# Altium footprint library PCBLIB.PcbLib: 557 footprints (part 1 of 36)
Each footprint in its own frame and in the unit in brackets; x right, y up, seen from the top. Pads: shape width x height; smd on the part's side, far side on the other; paste and mask are expansions set on the pad; w line width, h text height; cw(c..) or ccw(c..) is an arc to the next point about the centre after c.
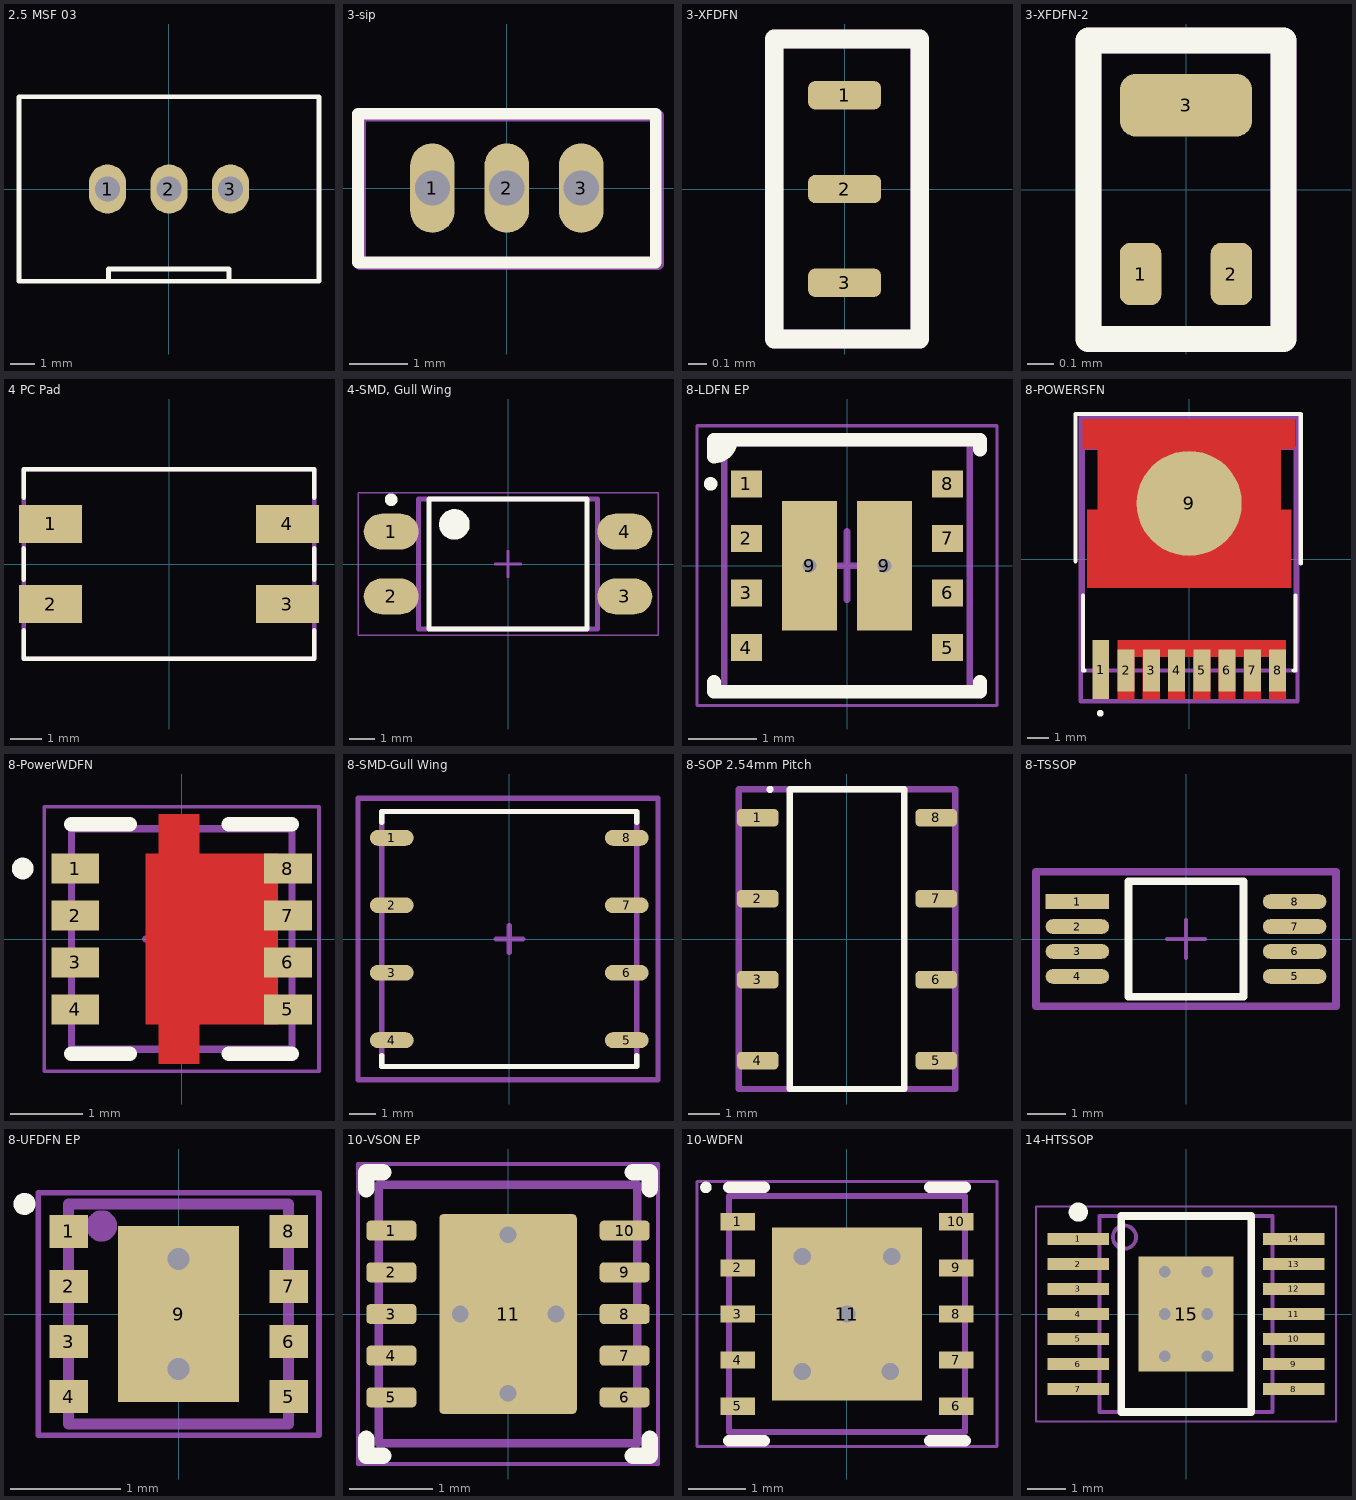
[diagram p0: the footprints below, top view; thin cyan lines are the x and y axes]

## 2.5 MSF 03 [mm]
pads (3):
  oval 1.5x2 hole 1: 1(-2.5,0) 2(0,0) 3(2.5,0)
Top Overlay:
  lines w0.2: -2.461,-3.75 -2.461,-3.254 2.449,-3.254 2.449,-3.75 ; -6.1,-3.75 6.1,-3.75 6.1,3.75 -6.1,3.75 -6.1,-3.75 ; -6.1,-3.75 -6.1,-3.75
ASM Top:
  lines w0.15: -6.1,-3.75 6.1,-3.75 6.1,3.75 ; -6.1,-3.75 -6.1,-3.75 ; -6.1,-3.75 -6.1,3.75 6.1,3.75 ; 6.1,3.75 6.1,3.75
  text ".designator" at -1.18,-0.01 h0.8
3D body "lumberg_2_5_MSF_03.stp": height 22.51, standoff -3.29, extent -6.1,-3.75 6.1,3.75

## 3-sip [mil]
height 314.96
pads (3):
  oval 30x60 hole 23.62: 1(-50,0) 2(0,0) 3(50,0)
Top Overlay:
  lines w7.87: -100,-50 -100,50 100,50 100,-50 -100,-50
ASM Top:
  lines w7.87: -98.43,-51.18 101.57,-51.18 101.57,48.82 -98.43,48.82 -98.43,-51.18
  text ".designator" at -47.24,-11.81 h31.5
3D body "HallEffect.stp": height 204.09, standoff -51.82, extent -116.82,-103.4 117.27,101.13

## 3-XFDFN [mm]
pads (3):
  rrect50% 0.39x0.15 smd mask+0.05: 1(0,0.5) 2(0,0) 3(0,-0.5)
Top Overlay:
  lines w0.1: -0.375,-0.8 0.4,-0.8 0.4,0.7 0.4,0.8 0.3,0.8 -0.375,0.8 -0.375,-0.8
ASM Top:
  lines w0.1: -0.375,-0.8 -0.375,0.8 0.3,0.8 0.4,0.8 0.4,0.7 0.4,-0.8 -0.375,-0.8
  text ".designator" at -0.275,-0.1 h0.8
3D body: height 0.35, standoff 0, extent -0.375,-0.8 0.4,0.8

## 3-XFDFN-2 [mm]
pads (3):
  rrect50% 0.16x0.24 smd mask+0.05: 1(-0.175,-0.325) 2(0.175,-0.325)
  rrect50% 0.51x0.24 smd mask+0.05: 3(0,0.325)
Top Overlay:
  lines w0.1: -0.375,-0.575 -0.375,0.575 -0.275,0.575 0.375,0.575 0.375,-0.575 -0.375,-0.575
ASM Top:
  lines w0.1: -0.375,-0.575 0.375,-0.575 0.375,0.575 -0.275,0.575 -0.375,0.575 -0.375,-0.575
  text ".designator" at -0.275,-0.1 h0.8
3D body "CSD13381F4--3DModel-STEP-56544.STEP": height 0.36, standoff 0.01, extent -0.3,-0.5 0.3,0.5

## 4 PC Pad [mm] "0.362\" L x 0.236\" W (9.20mm x 6.00mm)"
height 0.209
pads (4):
  rect 2x1.2 smd mask+0.05: 1(-3.75,1.27) 2(-3.75,-1.27) 3(3.75,-1.27) 4(3.75,1.27)
Top Overlay:
  lines w0.15: -4.6,-2.1 -4.6,-3 4.6,-3 4.6,-2.1 ; -4.6,-0.5 -4.6,0.5 ; -4.6,2.1 -4.6,3 4.6,3 4.6,2.1 ; 4.6,-0.5 4.6,0.5
ASM Top:
  lines w0.15: -4.6,-3 -4.6,3 4.6,3 4.6,-3 -4.6,-3
  text ".designator" at -1.8,0 h0.8
3D body "srf0905.stp": height 4.81, standoff 0.01, extent -4.601,-3 4.601,3

## 4-SMD, Gull Wing [mm] "SOP, 4-Leads, Body 4,60x6,50mm, Pitch 2,54mm, IPC Medium Density"
height 4
pads (4):
  oval 2.15x1.4 smd: 1(-4.575,1.27) 2(-4.575,-1.27) 3(4.575,-1.27) 4(4.575,1.27)
Top Overlay:
  circle w0.6: c-2.1,1.55 r0.3
  circle w0.25: c-4.575,2.52 r0.125
  lines w0.2: -3.1,-2.55 3.1,-2.55 3.1,2.55 -3.1,2.55 -3.1,-2.55
Mechanical 15:
  lines w0.05: -5.875,-2.8 5.875,-2.8 5.875,2.8 -5.875,2.8 -5.875,-2.8
  lines w0.1: -0.5,0 0.5,0 ; 0,-0.5 0,0.5
ASM Top:
  lines w0.2: -3.5,-2.55 -3.5,2.55 3.5,2.55 3.5,-2.55 -3.5,-2.55
  text ".designator" at -1.63,-0.19 h0.8
3D body "User Library-PDIP_4_smd.step": height 3.51, standoff 0.01, extent -5.08,-2.3 5.08,2.3

## 8-LDFN EP [mm] "MicroSIP, 8-Leads, Body 3.50x3.50mm, Pitch 0.80mm, Thermal Pad 0.00x0.00mm, IPC Medium Density"
height 1.75
pads (10):
  rect 0.45x0.4 smd: 1(-1.475,1.2) 2(-1.475,0.4) 3(-1.475,-0.4) 4(-1.475,-1.2) 5(1.475,-1.2) 6(1.475,-0.4) 7(1.475,0.4) 8(1.475,1.2)
  rect 0.8x1.9 smd paste-2: 9(-0.55,0) 9(0.55,0)
via -0.55,0 diameter 0.6 hole 0.2
via 0.55,0 diameter 0.6 hole 0.2
Top Overlay:
  circle w0.1: c-2,1.2 r0.05
  region: -1.95,1.85 -1.7,1.85 -1.95,1.6
  lines w0.2: -1.95,-1.7 -1.95,-1.85 1.95,-1.85 1.95,-1.7 ; -1.7,1.85 cw(c-1.95,1.85) -1.95,1.6 -1.95,1.85 1.95,1.85 1.95,1.7
Top Paste:
  rectangle: 0.17,0.145 0.93,0.905
  region: -0.17,0.905 -0.93,0.905 -0.93,0.145 -0.17,0.145
  region: -0.17,-0.145 -0.93,-0.145 -0.93,-0.905 -0.17,-0.905
  rectangle: 0.17,-0.905 0.93,-0.145
Mechanical 15:
  lines w0.05: -2.2,-2.05 -2.2,2.05 2.2,2.05 2.2,-2.05 -2.2,-2.05
  lines w0.1: -0.5,0 0.5,0 ; 0,-0.5 0,0.5
ASM Top:
  lines w0.1: -1.8,-1.8 1.8,-1.8 1.8,1.8 -1.8,1.8 -1.8,-1.8
  text ".designator" at 0,0.15 h0.8
3D body "TI LMZ21701.STEP": height 1.75, standoff 0, extent -1.75,-1.75 1.75,1.75

## 8-POWERSFN [mm]
pads (9):
  rect 0.8x2.8 smd paste-1000 mask+0: 1(-4.2,-5.25)
  rect 0.8x2 smd paste-1000 mask+0: 2(-2.995,-5.288) 3(-1.797,-5.288) 4(-0.6,-5.288) 5(0.605,-5.288) 6(1.795,-5.288) 7(3.007,-5.288) 8(4.204,-5.288)
  round 5 smd paste-1000 mask+0: 9(0,2.65)
Top Layer:
  region: -5.05,6.65 5.05,6.65 5.05,5.25 4.35,5.25 4.35,2.35 4.85,2.35 4.85,-1.35 -4.85,-1.35 -4.85,2.35 -4.35,2.35 -4.35,5.25 -5.05,5.25
  region: -3.4,-3.85 4.6,-3.85 4.6,-6.65 3.8,-6.65 3.8,-4.65 3.4,-4.65 3.4,-6.65 2.6,-6.65 2.6,-4.65 2.2,-4.65 2.2,-6.65 1.4,-6.65 1.4,-4.65 1,-4.65 1,-6.65 0.2,-6.65 0.2,-4.65 -0.2,-4.65 -0.2,-6.65 -1,-6.65 -1,-4.65 -1.4,-4.65 -1.4,-6.65 -2.2,-6.65 -2.2,-4.65 -2.6,-4.65 -2.6,-6.65 -3.4,-6.65
Top Overlay:
  circle w0.25: c-4.225,-7.325 r0.035
  lines w0.2: -5.4,-0.1 -5.4,6.9 5.3,6.9 5.3,-0.2 ; -5.05,-1.725 -5.05,-5.288 -4.975,-5.288 ; 4.975,-5.288 5.05,-5.288 5.05,-1.725
Top Paste:
  circle w0.5: c-4.2,5.83 r0.25
  circle w0.5: c-3,5.83 r0.25
  circle w0.5: c-1.8,5.83 r0.25
  circle w0.5: c-0.6,5.83 r0.25
  circle w0.5: c0.6,5.83 r0.25
  circle w0.5: c1.8,5.83 r0.25
  circle w0.5: c3,5.83 r0.25
  circle w0.5: c4.2,5.83 r0.25
  circle w0.5: c-3,4.63 r0.25
  circle w0.5: c-1.8,4.63 r0.25
  circle w0.5: c-0.6,4.63 r0.25
  circle w0.5: c0.6,4.63 r0.25
  circle w0.5: c1.8,4.63 r0.25
  circle w0.5: c3,4.63 r0.25
  circle w0.5: c-3,3.43 r0.25
  circle w0.5: c-1.8,3.43 r0.25
  circle w0.5: c-0.6,3.43 r0.25
  circle w0.5: c0.6,3.43 r0.25
  circle w0.5: c1.8,3.43 r0.25
  circle w0.5: c3,3.43 r0.25
  circle w0.5: c-3,2.23 r0.25
  circle w0.5: c-1.8,2.23 r0.25
  circle w0.5: c-0.6,2.23 r0.25
  circle w0.5: c0.6,2.23 r0.25
  circle w0.5: c1.8,2.23 r0.25
  circle w0.5: c3,2.23 r0.25
  circle w0.5: c-4.2,1.03 r0.25
  circle w0.5: c-3,1.03 r0.25
  circle w0.5: c-1.8,1.03 r0.25
  circle w0.5: c-0.6,1.03 r0.25
  circle w0.5: c0.6,1.03 r0.25
  circle w0.5: c1.8,1.03 r0.25
  circle w0.5: c3,1.03 r0.25
  circle w0.5: c4.2,1.03 r0.25
  circle w0.5: c-4.2,-0.17 r0.25
  circle w0.5: c-3,-0.17 r0.25
  circle w0.5: c-1.8,-0.17 r0.25
  circle w0.5: c-0.6,-0.17 r0.25
  circle w0.5: c0.6,-0.17 r0.25
  circle w0.5: c1.8,-0.17 r0.25
  circle w0.5: c3,-0.17 r0.25
  circle w0.5: c4.2,-0.17 r0.25
  rectangle: -4.55,-6.55 -3.85,-3.95
  rectangle: -3.35,-6.55 -2.65,-3.95
  rectangle: -2.15,-6.55 -1.45,-3.95
  rectangle: -0.95,-6.55 -0.25,-3.95
  rectangle: 0.25,-6.55 0.95,-3.95
  rectangle: 1.45,-6.55 2.15,-3.95
  rectangle: 2.65,-6.55 3.35,-3.95
  rectangle: 3.85,-6.55 4.55,-3.95
Mechanical 15:
  lines w0.2: -5.15,-6.75 5.15,-6.75 ; -5.15,-6.75 -5.15,6.75 ; -5.15,-6.75 -5.15,6.75 ; -5.15,-6.75 5.15,-6.75 ; -5.15,6.75 5.15,6.75 ; -5.15,6.75 5.15,6.75 ; 5.15,-6.75 5.15,6.75 ; 5.15,-6.75 5.15,6.75
Mechanical 16:
  lines w0.1: -0.5,0 0.5,0 ; 0,-0.5 0,0.5
ASM Top:
  lines w0.2: -5.05,-5.288 -5.05,5.288 5.05,5.288 5.05,-5.288 -5.05,-5.288
  text ".Designator" at 0,0.188 h1
3D body "Trans_Infineon_IPT111N20NFDATMA1_eec.STEP": height 2.4, standoff 0, extent -4.95,-5.837 4.95,5.838

## 8-PowerWDFN [mm] "DFN, 8-Leads, Body 3.05x3.05mm, Pitch 0.65mm"
height 0.8
pads (8):
  rect 0.66x0.42 smd paste-10: 1(-1.47,0.975) 2(-1.47,0.325) 3(-1.47,-0.325) 4(-1.47,-0.975) 5(1.47,-0.975) 6(1.47,-0.325) 7(1.47,0.325) 8(1.47,0.975)
Top Layer:
  region: 1.33,-1.185 1.33,1.185 -0.5,1.185 -0.5,-1.185
  region: 0.25,-1.73 0.25,1.73 -0.32,1.73 -0.32,-1.73
Top Overlay:
  circle w0.2: c-2.2,0.975 r0.05
  lines w0.2: -1.525,-1.585 -0.72,-1.585 ; -1.525,1.585 -0.72,1.585 ; 0.65,-1.585 1.525,-1.585 ; 0.65,1.585 1.525,1.585
Top Paste:
  region: -1.14,-1.095 -1.14,-0.855 -1.74,-0.855 -1.74,-1.095
  region: -1.14,-0.445 -1.14,-0.205 -1.74,-0.205 -1.74,-0.445
  region: -1.14,0.205 -1.14,0.445 -1.74,0.445 -1.74,0.205
  region: -1.14,0.855 -1.14,1.095 -1.74,1.095 -1.74,0.855
  region: 1.8,0.855 1.8,1.095 1.2,1.095 1.2,0.855
  region: 1.8,0.205 1.8,0.445 1.2,0.445 1.2,0.205
  region: 1.8,-0.445 1.8,-0.205 1.2,-0.205 1.2,-0.445
  region: 1.8,-1.095 1.8,-0.855 1.2,-0.855 1.2,-1.095
  rectangle: -0.244,1.3 0.191,1.65
  rectangle: -0.244,-1.65 0.191,-1.3
  region: -0.35,0.545 -0.35,-0.545 1,-0.545 1,0.545
  region: -0.35,-0.855 -0.35,-1.095 1.05,-1.095 1.05,-0.855
  region: -0.35,1.095 -0.35,0.855 1.05,0.855 1.05,1.095
Mechanical 15:
  lines w0.05: -1.9,-1.83 -1.9,1.83 1.9,1.83 1.9,-1.83 -1.9,-1.83
  lines w0.1: -0.5,0 0.5,0 ; 0,-0.5 0,0.5
ASM Top:
  lines w0.1: -1.525,-1.525 1.525,-1.525 1.525,1.525 -1.525,1.525 -1.525,-1.525
  text ".designator" at -0.5,-0.325 h0.8
3D body: height 0.8, standoff 0, extent -1.525,-1.525 1.525,1.525

## 8-SMD-Gull Wing [mm]
height 4.2
pads (9):
  oval 1.65x0.6 smd mask+0.05: 1(-4.425,3.81) 1(-4.425,3.81) 2(-4.425,1.27) 3(-4.425,-1.27) 4(-4.425,-3.81) 5(4.425,-3.81) 6(4.425,-1.27) 7(4.425,1.27) 8(4.425,3.81)
Top Overlay:
  lines w0.2: -4.8,-4.4 -4.8,-4.8 4.8,-4.8 4.8,-4.4 ; -4.8,4.4 -4.8,4.8 4.8,4.8 4.8,4.4
Mechanical 15:
  lines w0.2: -0.5,0 0.5,0 ; 0,-0.5 0,0.5 ; -5.7,-5.3 -5.7,5.3 5.6,5.3 5.6,-5.3 -5.7,-5.3
ASM Top:
  lines w0.2: -4.8,-4.8 -4.8,4.8 4.8,4.8 4.8,-4.8 -4.8,-4.8
  text ".designator" at -0.4,0 h0.8
3D body "SI8920BC-IP.stp": height 4.19, standoff 0, extent -4.825,-4.825 4.825,4.825

## 8-SOP 2.54mm Pitch [mm] "8-SOP (0.150\", 3.81mm Width)"
pads (8):
  rrect50% 1.3x0.55 smd paste-0.05 mask+0.05: 1(-2.8,3.81) 2(-2.8,1.27) 3(-2.8,-1.27) 4(-2.8,-3.81) 5(2.8,-3.81) 6(2.8,-1.27) 7(2.8,1.27) 8(2.8,3.81)
Top Overlay:
  circle w0.2: c-2.415,4.7 r0.011
  lines w0.2: 1.8,4.7 1.8,-4.7 -1.8,-4.7 -1.8,4.7 1.8,4.7 ; 1.8,4.7 1.8,4.7
ASM Top:
  circle w0.2: c-2.415,3.81 r0.01
  lines w0.2: -3.4,-4.7 -3.4,4.7 3.4,4.7 3.4,-4.7 ; -3.4,-4.7 -3.4,-4.7 ; -3.4,-4.7 3.4,-4.7 ; 3.4,-4.7 3.4,-4.7
  text ".designator" at -0.4,-0.1 h0.8
3D body "User Library-sop8-2_54.step": height 2.16, standoff 0.11, extent -3.4,-4.7 3.4,4.7

## 8-TSSOP [mm]
pads (8):
  rect 1.655x0.381 smd paste+0 mask+0: 1(-2.825,0.975)
  rrect100% 1.655x0.381 smd paste+0 mask+0: 2(-2.825,0.325) 3(-2.825,-0.325) 4(-2.825,-0.975) 5(2.825,-0.975) 6(2.825,-0.325) 7(2.825,0.325) 8(2.825,0.975)
Top Overlay:
  lines w0.2: -1.498,-1.5 1.498,-1.5 1.498,1.5 -1.498,1.5 -1.498,-1.5
Mechanical 15:
  lines w0.1: -0.5,0 0.5,0 ; 0,-0.5 0,0.5
  lines w0.2: -3.903,-1.75 3.903,-1.75 3.903,1.75 -3.903,1.75 -3.903,-1.75
ASM Top:
  lines w0.2: -3.903,-1.75 3.903,-1.75 3.903,1.75 -3.903,1.75 -3.903,-1.75
  text ".designator" at 0,0.188 h1
3D body "IC_Texas_Instruments_INA240A1PWR_eec.STEP": height 1.3, standoff 0, extent -3.2,-1.5 3.2,1.5

## 8-UFDFN EP [mm] "SON, 8-Leads, Body 2x2mm, Pitch 0.5mm, Thermal Pad 1.6x1mm"
height 0.65
pads (9):
  rect 0.35x0.3 smd mask+0.05: 1(-1,0.75) 2(-1,0.25) 3(-1,-0.25) 4(-1,-0.75) 5(1,-0.75) 6(1,-0.25) 7(1,0.25) 8(1,0.75)
  rect 1.1x1.6 smd mask+0.05: 9(0,0)
via 0,-0.5 diameter 0.5 hole 0.2
via 0,0.5 diameter 0.5 hole 0.2
Top Overlay:
  circle w0.1: c-1.4,1 r0.05
Mechanical 15:
  lines w0.05: -1.275,-1.1 1.275,-1.1 1.275,1.1 -1.275,1.1 -1.275,-1.1
  lines w0.1: -0.5,0 0.5,0 ; 0,-0.5 0,0.5
ASM Top:
  circle w0.2: c-0.7,0.8 r0.041
  lines w0.1: -1,-1 1,-1 1,1 -1,1 -1,-1
  text ".designator" at 0.1,-0.3 h0.8
3D body "IC_STMicroelectronics_LM393QT_eec.STEP": height 0.6, standoff 0, extent -1,-1 1,1

## 10-VSON EP [mm] "SON, 10-Leads, Body 3x3mm, Pitch 0.5mm, Thermal Pad 2.4x1.65mm, TI Recommended"
height 1
pads (11):
  rrect42% 0.6x0.24 smd: 1(-1.4,1) 2(-1.4,0.5) 3(-1.4,0) 4(-1.4,-0.5) 5(-1.4,-1) 6(1.4,-1) 7(1.4,-0.5) 8(1.4,0) 9(1.4,0.5) 10(1.4,1)
  rrect6% 1.65x2.4 smd paste-0.825: 11(0,0)
via -0.575,0 diameter 0.5 hole 0.2
via 0.575,0 diameter 0.5 hole 0.2
via 0,0.95 diameter 0.5 hole 0.2
via 0,-0.95 diameter 0.5 hole 0.2
Top Overlay:
  lines w0.2: -1.7,-1.5 -1.7,-1.7 -1.5,-1.7 ; -1.7,1.5 -1.7,1.7 -1.5,1.7 ; 1.5,-1.7 1.7,-1.7 1.7,-1.5 ; 1.5,1.7 1.7,1.7 1.7,1.5
Top Paste:
  rectangle: -0.3,-0.6 0.3,-0.1
  rectangle: -0.7,0.4 -0.4,1.1
  rectangle: -0.3,0.1 0.3,0.6
  region: 0.7,1.1 0.4,1.1 0.4,0.4 0.7,0.4
  region: 0.7,-0.4 0.4,-0.4 0.4,-1.1 0.7,-1.1
  rectangle: -0.7,-1.1 -0.4,-0.4
Mechanical 15:
  lines w0.05: -1.8,-1.8 -1.8,1.8 1.8,1.8 1.8,-1.8 -1.8,-1.8
  lines w0.1: -0.5,0 0.5,0 ; 0,-0.5 0,0.5
ASM Top:
  lines w0.1: -1.55,-1.55 -1.55,1.55 1.55,1.55 1.55,-1.55 -1.55,-1.55
  text ".designator" at -0.4,-0.2 h0.8
3D body: height 1, standoff 0, extent -1.55,-1.55 1.55,1.55

## 10-WDFN [mm] "SON, 10-Leads, Body 4,00x4,00mm, Pitch 0,80mm, Thermal Pad 3,00x2,09mm, IPC Medium Density"
height 0.8
pads (11):
  rect 0.6x0.3 smd: 1(-1.9,1.6) 2(-1.9,0.8) 3(-1.9,0) 4(-1.9,-0.8) 5(-1.9,-1.6) 6(1.9,-1.6) 7(1.9,-0.8) 8(1.9,0) 9(1.9,0.8) 10(1.9,1.6)
  rect 2.6x3 smd paste-10: 11(0,0)
via -0.775,1 diameter 0.5 hole 0.3
via 0.775,1 diameter 0.5 hole 0.3
via -0.775,-1 diameter 0.5 hole 0.3
via 0.75,-1 diameter 0.5 hole 0.3
via 0,0 diameter 0.5 hole 0.3
Top Overlay:
  circle w0.1: c-2.45,2.2 r0.05
  lines w0.2: -2.05,-2.2 -1.44,-2.2 ; -2.05,2.2 -1.44,2.2 ; 1.44,-2.2 2.05,-2.2 ; 1.44,2.2 2.05,2.2
Top Paste:
  region: -0.525,0.65 -1.175,0.65 -1.175,-0.65 -0.525,-0.65
  rectangle: -0.275,-1.425 0.325,-0.35
  rectangle: 0.525,-0.65 1.175,0.65
  rectangle: -0.275,0.35 0.325,1.425
Mechanical 15:
  lines w0.05: -2.605,-2.3 -2.605,2.3 2.605,2.3 2.605,-2.3 -2.605,-2.3
  lines w0.1: -0.5,0 0.5,0 ; 0,-0.5 0,0.5
ASM Top:
  circle w0.1: c-1.15,1.15 r0.05
  lines w0.1: -2.05,-2.05 -2.05,2.05 2.05,2.05 2.05,-2.05 -2.05,-2.05
  text ".designator" at 0,0 h1.2
3D body "User Library-WDFN-10 4x4.STEP": height 0.75, standoff -0.05, extent -2.02,-2 2.02,2

## 14-HTSSOP [mm] "TSOP, 14-Leads, Body 5.00x4.40mm, Pitch 0.65mm, Thermal Pad 3.00x2.46mm, IPC Medium Density"
height 1.2
pads (15):
  rect 1.6x0.3 smd: 1(-2.8,1.95) 2(-2.8,1.3) 3(-2.8,0.65) 4(-2.8,0) 5(-2.8,-0.65) 6(-2.8,-1.3) 7(-2.8,-1.95) 8(2.8,-1.95) 9(2.8,-1.3) 10(2.8,-0.65) 11(2.8,0) 12(2.8,0.65) 13(2.8,1.3) 14(2.8,1.95)
  rect 2.46x3 smd: 15(0,0)
via -0.55,1.1 diameter 0.5 hole 0.3
via 0.55,1.1 diameter 0.5 hole 0.3
via -0.55,0 diameter 0.5 hole 0.3
via 0.55,0 diameter 0.5 hole 0.3
via -0.55,-1.1 diameter 0.5 hole 0.3
via 0.55,-1.1 diameter 0.5 hole 0.3
Top Overlay:
  circle w0.25: c-2.8,2.65 r0.125
  lines w0.2: -1.681,-2.55 -1.681,2.55 1.7,2.55 1.7,-2.55 -1.681,-2.55
Mechanical 15:
  lines w0.05: -3.9,-2.8 -3.9,2.8 3.9,2.8 3.9,-2.8 -3.9,-2.8
  lines w0.1: -0.5,0 0.5,0 ; 0,-0.5 0,0.5
ASM Top:
  circle w0.1: c-1.6,2 r0.3
  lines w0.1: -2.25,-2.55 2.25,-2.55 2.25,2.55 -2.25,2.55 -2.25,-2.55
  text ".Designator" at 0.4,-2.3 h1.52
3D body "14-HTSSOP.step": height 1.2, standoff 0, extent -3.2,-2.55 3.2,2.55